# Altium footprint library THD Connectors-2.PcbLib: 84 footprints (part 6 of 6)
Each footprint in its own frame and in the unit in brackets; x right, y up, seen from the top. Pads: shape width x height; smd on the part's side, far side on the other; paste and mask are expansions set on the pad; w line width, h text height; cw(c..) or ccw(c..) is an arc to the next point about the centre after c.
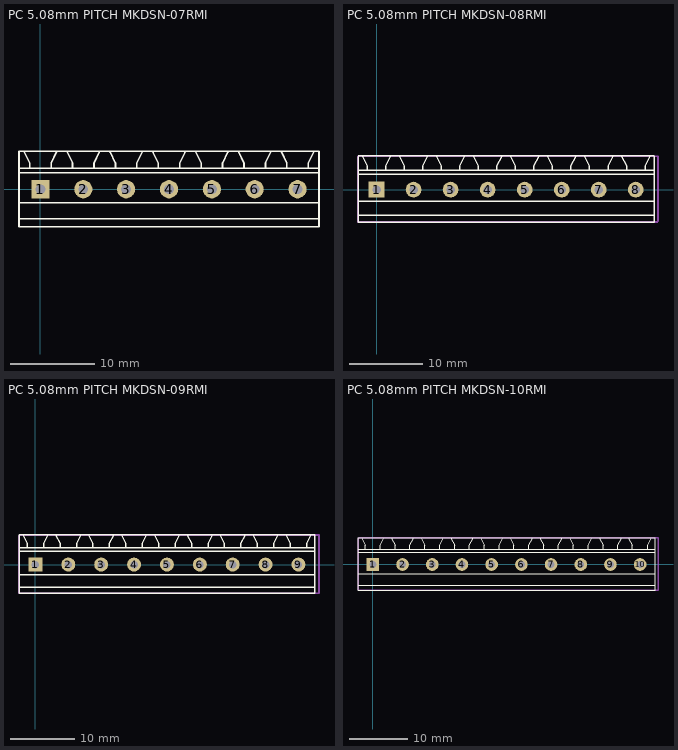
[diagram p5: the footprints below, top view; thin cyan lines are the x and y axes]

## PC 5.08mm PITCH MKDSN-07RMI [mil] "Phoenix Contact 5.08"
pads (7):
  rect 85x85 hole 46: 1(0,0)
  round 85 hole 46: 2(200,0) 3(400,0) 4(600,0) 5(800,0) 6(1000,0) 7(1200,0)
Top Overlay:
  lines w8: -100,-138.33 1300,-138.33 ; -100,-63.33 1300,-63.33 ; -100,76.67 1300,76.67 ; -100,98.33 1300,98.33 ; -100,176.67 1300,176.67 ; -100,177.16 -100,-175 1300,-175 1300,175 ; -75,173.33 -50,123.33 -50,98.33 ; 50,98.33 50,123.33 75,173.33 ; 125,173.33 150,123.33 150,98.33 ; 250,98.33 250,123.33 275,173.33 ; 325,173.33 350,123.33 350,98.33 ; 450,98.33 450,123.33 475,173.33 ; 525,173.33 550,123.33 550,98.33 ; 650,98.33 650,123.33 675,173.33 ; 725,173.33 750,123.33 750,98.33 ; 850,98.33 850,123.33 875,173.33 ; 925,173.33 950,123.33 950,98.33 ; 1050,98.33 1050,123.33 1075,173.33 ; 1125,173.33 1150,123.33 1150,98.33 ; 1250,98.33 1250,123.33 1275,173.33
3D body "MKDSN-7RMI-5.08.STEP": height 531.53, standoff -137.79, extent -100,-177.17 1321.65,177.16

## PC 5.08mm PITCH MKDSN-08RMI [mil] "Phoenix Contact 5.08"
pads (8):
  rect 85x85 hole 46: 1(0,0)
  round 85 hole 46: 2(200,0) 3(400,0) 4(600,0) 5(800,0) 6(1000,0) 7(1200,0) 8(1400,0)
Top Overlay:
  lines w8: -100,-138.33 1500,-138.33 ; -100,-63.33 1500,-63.33 ; -100,81.67 1500,81.67 ; -100,103.33 1500,103.33 ; -100,177.16 -100,-175 1500,-175 1500,180 ; -100,181.67 1500,181.67 ; -75,178.33 -50,128.33 -50,103.33 ; 50,103.33 50,128.33 75,178.33 ; 125,178.33 150,128.33 150,103.33 ; 250,103.33 250,128.33 275,178.33 ; 325,178.33 350,128.33 350,103.33 ; 450,103.33 450,128.33 475,178.33 ; 525,178.33 550,128.33 550,103.33 ; 650,103.33 650,128.33 675,178.33 ; 725,178.33 750,128.33 750,103.33 ; 850,103.33 850,128.33 875,178.33 ; 925,178.33 950,128.33 950,103.33 ; 1050,103.33 1050,128.33 1075,178.33 ; 1125,178.33 1150,128.33 1150,103.33 ; 1250,103.33 1250,128.33 1275,178.33 ; 1325,178.33 1350,128.33 1350,103.33 ; 1450,103.33 1450,128.33 1475,178.33
Mechanical 15:
  lines w10: -100,-175 -100,180 1520,180 1520,-170 1515,-175 -100,-175
3D body "MKDSN-8RMI-5.08.STEP": height 531.53, standoff -137.79, extent -99.99,-177.16 1521.65,177.16

## PC 5.08mm PITCH MKDSN-09RMI [mil] "Phoenix Contact 5.08"
pads (9):
  rect 85x85 hole 46: 1(0,0)
  round 85 hole 46: 2(200,0) 3(400,0) 4(600,0) 5(800,0) 6(1000,0) 7(1200,0) 8(1400,0) 9(1600,0)
Top Overlay:
  lines w8: -100,-138.33 1700,-138.33 ; -100,-63.33 1700,-63.33 ; -100,81.67 1700,81.67 ; -100,103.33 1700,103.33 ; -100,180 -100,-175 1700,-175 1700,180 ; -100,181.67 1700,181.67 ; -75,178.33 -50,128.33 -50,103.33 ; 50,103.33 50,128.33 75,178.33 ; 125,178.33 150,128.33 150,103.33 ; 250,103.33 250,128.33 275,178.33 ; 325,178.33 350,128.33 350,103.33 ; 450,103.33 450,128.33 475,178.33 ; 525,178.33 550,128.33 550,103.33 ; 650,103.33 650,128.33 675,178.33 ; 725,178.33 750,128.33 750,103.33 ; 850,103.33 850,128.33 875,178.33 ; 925,178.33 950,128.33 950,103.33 ; 1050,103.33 1050,128.33 1075,178.33 ; 1125,178.33 1150,128.33 1150,103.33 ; 1250,103.33 1250,128.33 1275,178.33 ; 1325,178.33 1350,128.33 1350,103.33 ; 1450,103.33 1450,128.33 1475,178.33 ; 1525,178.33 1550,128.33 1550,103.33 ; 1650,103.33 1650,128.33 1675,178.33
Mechanical 15:
  lines w10: -100,-175 1725,-175 1725,180 -95,180 -100,175 -100,-175
3D body "MKDSN-9RMI-5.08.STEP": height 531.53, standoff -137.79, extent -100.01,-177.16 1721.65,177.17

## PC 5.08mm PITCH MKDSN-10RMI [mil] "Phoenix Contact 5.08"
pads (10):
  rect 85x85 hole 46: 1(0,0)
  round 85 hole 46: 2(200,0) 3(400,0) 4(600,0) 5(800,0) 6(1000,0) 7(1200,0) 8(1400,0) 9(1600,0) 10(1800,0)
Top Overlay:
  lines w8: -100,-138.33 1895,-138.33 ; -100,-63.33 1900,-63.33 ; -100,81.67 1895,81.67 ; -100,103.33 1900,103.33 ; -100,180 -100,-175 1900,-175 1900,181.67 -100,181.67 ; -75,178.33 -50,128.33 -50,103.33 ; 50,103.33 50,128.33 75,178.33 ; 125,178.33 150,128.33 150,103.33 ; 250,103.33 250,128.33 275,178.33 ; 325,178.33 350,128.33 350,103.33 ; 450,103.33 450,128.33 475,178.33 ; 525,178.33 550,128.33 550,103.33 ; 650,103.33 650,128.33 675,178.33 ; 725,178.33 750,128.33 750,103.33 ; 850,103.33 850,128.33 875,178.33 ; 925,178.33 950,128.33 950,103.33 ; 1050,103.33 1050,128.33 1075,178.33 ; 1125,178.33 1150,128.33 1150,103.33 ; 1250,103.33 1250,128.33 1275,178.33 ; 1325,178.33 1350,128.33 1350,103.33 ; 1450,103.33 1450,128.33 1475,178.33 ; 1525,178.33 1550,128.33 1550,103.33 ; 1650,103.33 1650,128.33 1675,178.33 ; 1720,178.33 1745,128.33 1745,103.33 ; 1850,103.33 1850,128.33 1875,178.33
Mechanical 15:
  lines w10: -100,-175 1920,-175 1920,180 -95,180 -100,175 -100,-175
3D body "MKDSN-10RMI-5.08.STEP": height 531.53, standoff -137.79, extent -100,-177.17 1921.65,177.16